# Altium footprint library 封装库.PcbLib: 755 footprints (part 24 of 48)
Each footprint in its own frame and in the unit in brackets; x right, y up, seen from the top. Pads: shape width x height; smd on the part's side, far side on the other; paste and mask are expansions set on the pad; w line width, h text height; cw(c..) or ccw(c..) is an arc to the next point about the centre after c.
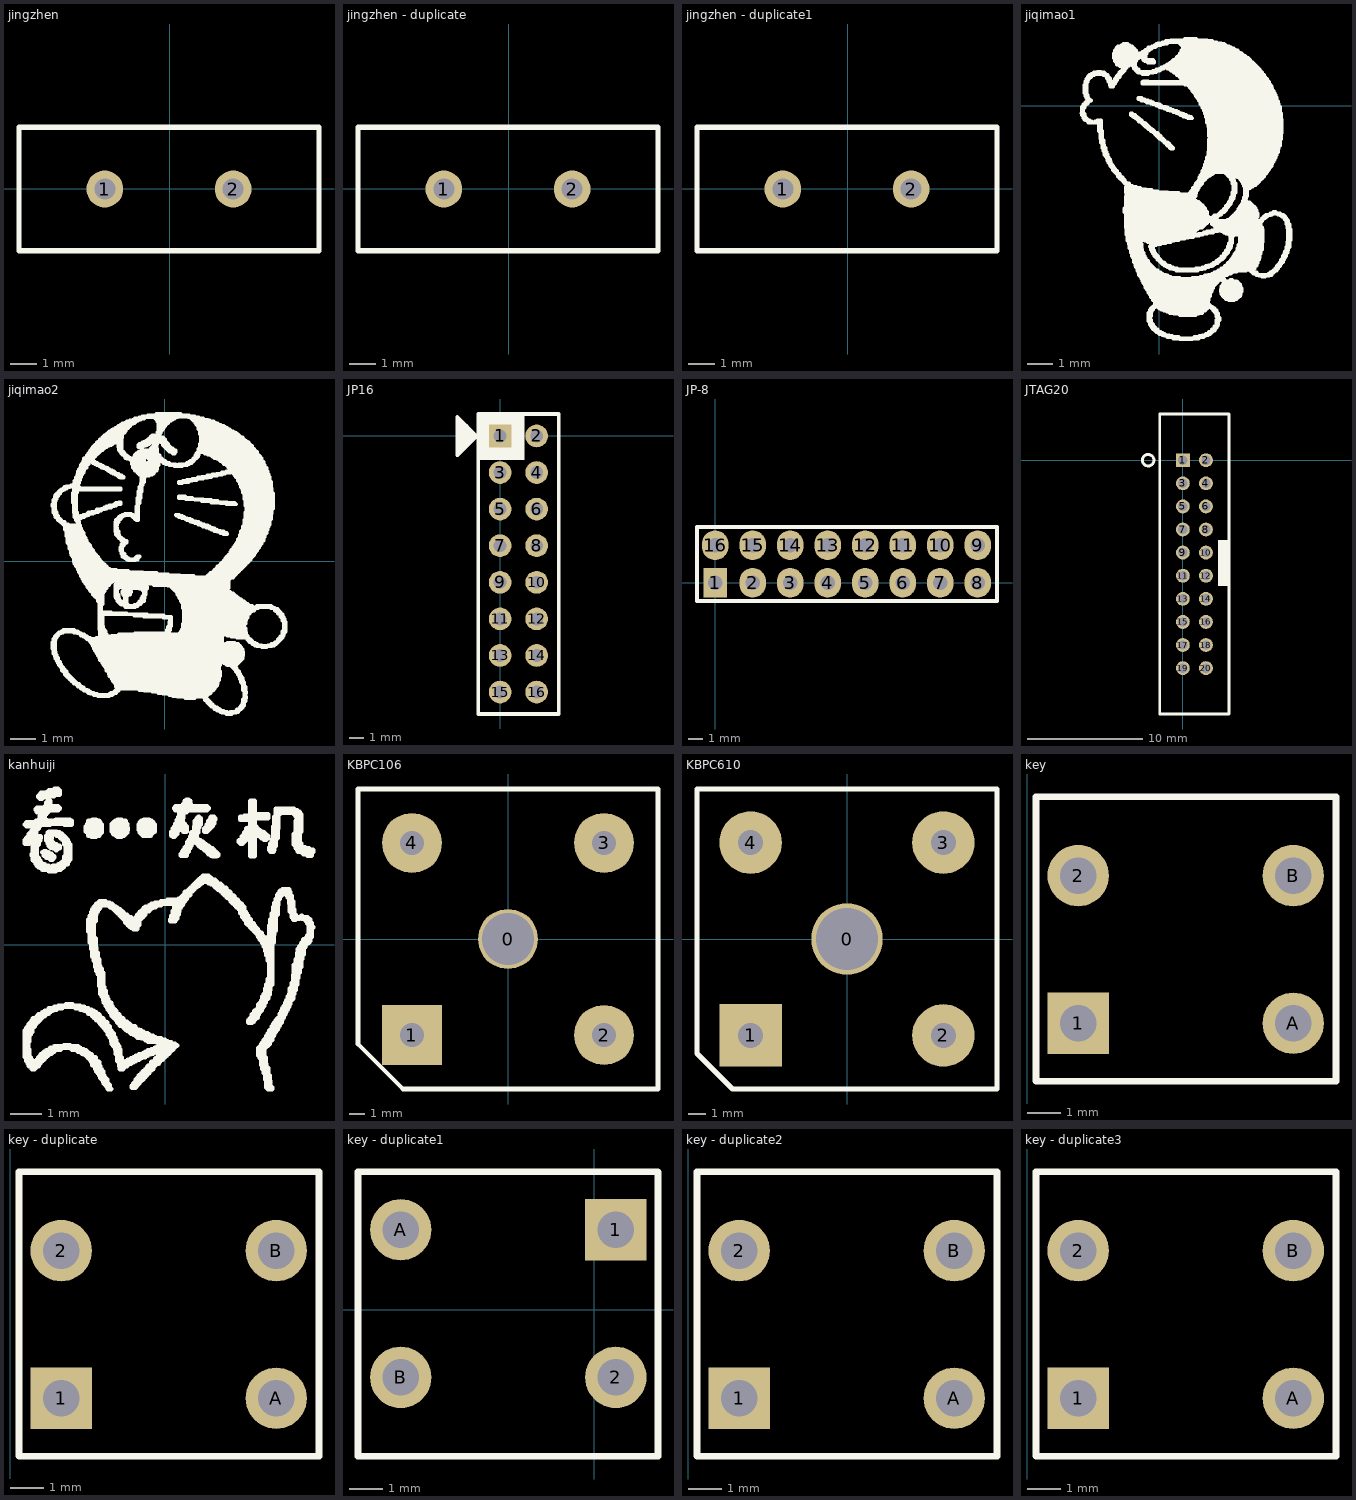
[diagram p23: the footprints below, top view; thin cyan lines are the x and y axes]

## jingzhen [mm]
height 4
pads (2):
  round 1.4 hole 0.8: 1(-2.476,-0.008) 2(2.404,-0.008)
Top Overlay:
  lines w0.2: -5.736,-2.358 5.664,-2.358 5.664,2.342 -5.736,2.342 -5.736,-2.358

## jingzhen - duplicate [mm]
height 4
pads (2):
  round 1.4 hole 0.8: 1(-2.476,-0.008) 2(2.404,-0.008)
Top Overlay:
  lines w0.2: -5.736,-2.358 -5.736,2.342 5.664,2.342 5.664,-2.358 -5.736,-2.358

## jingzhen - duplicate1 [mm]
height 4
pads (2):
  round 1.4 hole 0.8: 1(-2.476,-0.008) 2(2.404,-0.008)
Top Overlay:
  lines w0.2: -5.736,-2.358 -5.736,2.342 5.664,2.342 5.664,-2.358 -5.736,-2.358

## jiqimao1 [mm]
Top Overlay:
  drawing of 893 lines, arcs and shapes, not listed

## jiqimao2 [mm]
Top Overlay:
  drawing of 1083 lines, arcs and shapes, not listed

## JP16 [mil]
pads (16):
  rect 62x62 hole 35: 1(0,0)
  round 62 hole 35: 2(100,0) 3(0,-100) 4(100,-100) 5(0,-200) 6(100,-200) 7(0,-300) 8(100,-300) 9(0,-400) 10(100,-400) 11(0,-500) 12(100,-500) 13(0,-600) 14(100,-600) 15(0,-700) 16(100,-700)
Top Overlay:
  region: -60,-64.57 65.35,-64.57 65.35,60 -60,60
  lines w10: -116.93,-20.47 -116.93,-52.76 -116.54,-53.15 -116.54,-52.76 -63.94,-0.16 -63.94,0 -63.94,-1.18 -63.94,-1.02 -116.93,51.97 -116.93,-35.83 -109.57,-39.25 -109.57,44.61 ; -100.86,35.9 -100.86,-33 -100.79,-33.07 ; -92.52,-25.59 -92.03,-25.1 -92.03,27.07 ; -83.43,-12.96 -83.43,18.47 ; -76.1,-6.02 -76.1,11.13 ; -60,-50 50,-50 50,60 ; -60,-760 -60,-660 -60,60 0,60 160,60 160,-660 160,-760 -60,-760

## JP-8 [mm]
pads (16):
  rect 1.6x2 hole 1: 1(0,0)
  oval 1.8x2 hole 1: 2(2.54,0) 3(5.08,0) 4(7.62,0) 5(10.16,0) 6(12.7,0) 7(15.24,0) 8(17.78,0) 9(17.78,2.54) 10(15.24,2.54) 11(12.7,2.54) 12(10.16,2.54) 13(7.62,2.54) 14(5.08,2.54) 15(2.54,2.54) 16(0,2.54)
Top Overlay:
  lines w0.254: -1.23,-1.23 19.09,-1.23 19.09,3.77 -1.23,3.77 -1.23,-1.23

## JTAG20 [mm]
pads (20):
  rect 1.2x1.2 hole 0.8: 1(0,0)
  round 1.2 hole 0.8: 2(2,0) 3(0,-2) 4(2,-2) 5(0,-4) 6(2,-4) 7(0,-6) 8(2,-6) 9(0,-8) 10(2,-8) 11(0,-10) 12(2,-10) 13(0,-12) 14(2,-12) 15(0,-14) 16(2,-14) 17(0,-16) 18(2,-16) 19(0,-18) 20(2,-18)
Top Overlay:
  circle w0.254: c-3,0 r0.5
  rectangle: 3.048,-8.893 4.048,-6.893
  rectangle: 3.048,-10.89 4.048,-8.89
  lines w0.254: -2,-21.971 -2,4 -1,4 3,4 4,4 4,-21.971 -2,-21.971

## kanhuiji [mm]
Top Overlay:
  drawing of 1022 lines, arcs and shapes, not listed

## KBPC106 [mm]
pads (5):
  round 4 hole 3.5: 0(0,0)
  rect 4x4 hole 1.6: 1(-6.4,-6.4)
  round 4 hole 1.6: 2(6.4,-6.4) 3(6.4,6.4) 4(-6.4,6.4)
Top Overlay:
  lines w0.305: -10,-7 -7,-10 10,-10 10,10 -10,10 -10,-7

## KBPC610 [mm]
pads (5):
  round 4 hole 3.5: 0(0,0)
  rect 3.5x3.5 hole 1.4: 1(-5.4,-5.4)
  round 3.5 hole 1.4: 2(5.4,-5.4) 3(5.4,5.4) 4(-5.4,5.4)
Top Overlay:
  lines w0.305: -8.4,-6.4 -8.4,8.4 8.4,8.4 8.4,-8.4 -6.4,-8.4 -8.4,-6.4

## key [mm]
pads (4):
  rect 1.85x1.85 hole 1.1: 1(1.537,8.02)
  round 1.85 hole 1.1: 2(1.537,12.465) A(8.014,8.02) B(8.014,12.465)
Top Overlay:
  lines w0.2: 0.267,6.28 9.3,6.273 9.3,14.839 0.267,14.84 0.267,6.28

## key - duplicate [mm]
pads (4):
  rect 1.85x1.85 hole 1.1: 1(1.537,8.02)
  round 1.85 hole 1.1: 2(1.537,12.465) A(8.014,8.02) B(8.014,12.465)
Top Overlay:
  lines w0.2: 0.267,6.28 9.3,6.273 9.3,14.839 0.267,14.84 0.267,6.28

## key - duplicate1 [mm]
height 1.73
pads (4):
  rect 1.85x1.85 hole 1.1: 1(0.646,2.411)
  round 1.85 hole 1.1: 2(0.646,-2.034) A(-5.831,2.411) B(-5.831,-2.034)
Top Overlay:
  lines w0.2: -7.117,-4.408 1.916,-4.409 1.916,4.151 -7.117,4.159 -7.117,-4.408

## key - duplicate2 [mm]
pads (4):
  rect 1.85x1.85 hole 1.1: 1(1.537,8.02)
  round 1.85 hole 1.1: 2(1.537,12.465) A(8.014,8.02) B(8.014,12.465)
Top Overlay:
  lines w0.2: 0.267,6.28 9.3,6.273 9.3,14.839 0.267,14.84 0.267,6.28

## key - duplicate3 [mm]
pads (4):
  rect 1.85x1.85 hole 1.1: 1(1.537,8.02)
  round 1.85 hole 1.1: 2(1.537,12.465) A(8.014,8.02) B(8.014,12.465)
Top Overlay:
  lines w0.2: 0.267,6.28 9.3,6.273 9.3,14.839 0.267,14.84 0.267,6.28